# Altium footprint library My_Intlib.PcbLib: 224 footprints (part 5 of 14)
Each footprint in its own frame and in the unit in brackets; x right, y up, seen from the top. Pads: shape width x height; smd on the part's side, far side on the other; paste and mask are expansions set on the pad; w line width, h text height; cw(c..) or ccw(c..) is an arc to the next point about the centre after c.
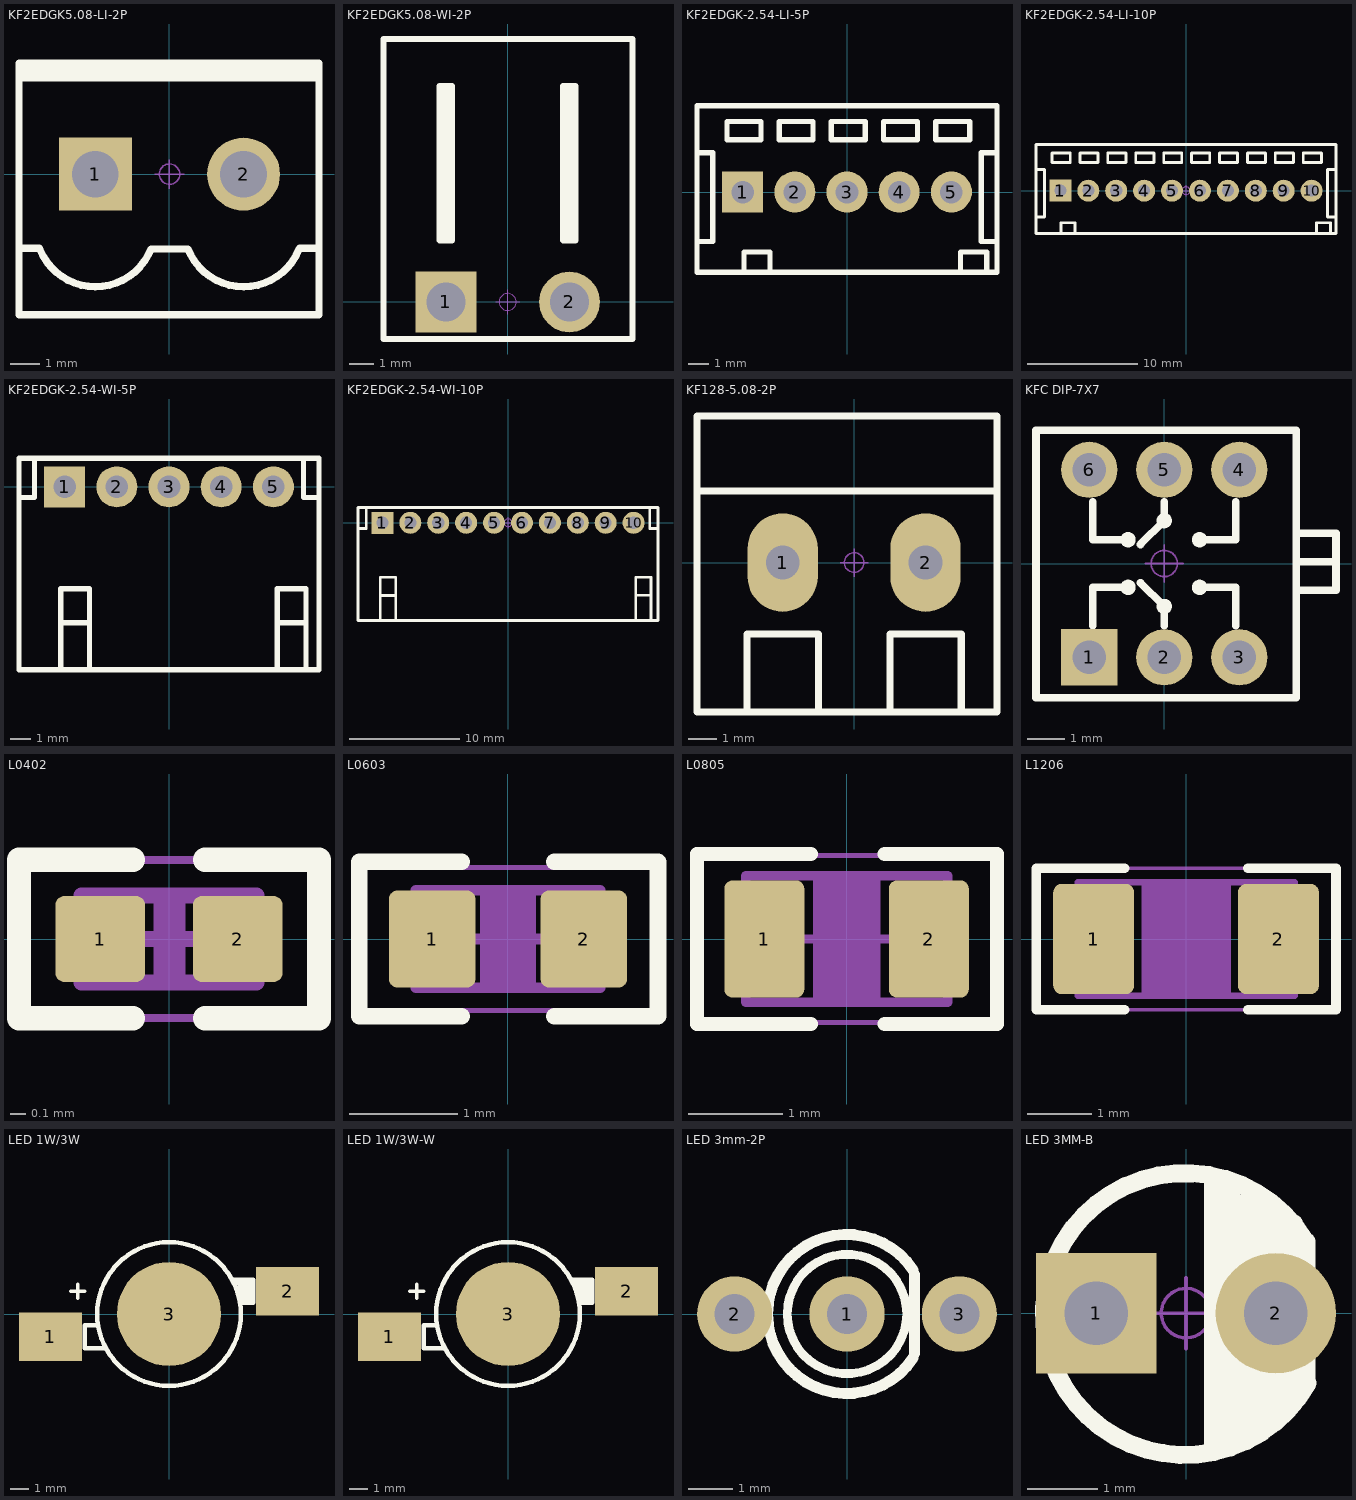
[diagram p4: the footprints below, top view; thin cyan lines are the x and y axes]

## KF2EDGK5.08-LI-2P [mm] "立插端子"
pads (2):
  rect 2.5x2.5 hole 1.6: 1(-2.54,0)
  round 2.5 hole 1.6: 2(2.54,0)
Top Overlay:
  lines w0.254: -5.16,3.302 5.127,3.302 ; -5.16,3.556 5.127,3.556 ; -5.08,-2.54 -4.47,-2.54 ; -4.445,-2.565 ccw(c-2.54,-1.812) -0.635,-2.565 0,-2.565 0.635,-2.565 ccw(c2.54,-1.812) 4.445,-2.565 ; 4.47,-2.54 5.08,-2.54 ; -5.16,-4.826 -5.16,3.81 5.127,3.81 5.127,-4.826 -5.16,-4.826
Mechanical 15:
  circle w0.05: c0,0 r0.35
  lines w0.05: -0.5,0 0.5,0 ; 0,-0.5 0,0.5
3D body "KF2EDGK-1P.STEP": height 11.25, standoff -2.95, extent -5.08,-4.75 0,3.75
3D body "KF2EDGK-1P.STEP": height 11.25, standoff -2.95, extent 0,-4.75 5.08,3.75

## KF2EDGK5.08-WI-2P [mm] "卧插端子"
pads (2):
  rect 2.5x2.5 hole 1.6: 1(-2.54,0)
  round 2.5 hole 1.6: 2(2.54,0)
Top Overlay:
  lines w0.254: -2.54,2.54 -2.54,8.89 ; 2.54,2.54 2.54,8.89 ; -2.54,8.89 -2.794,8.89 -2.794,2.54 -2.286,2.54 -2.286,8.89 -2.54,8.89 ; 2.54,8.89 2.794,8.89 2.794,2.54 2.286,2.54 2.286,8.89 2.54,8.89 ; -5.105,-1.524 -5.105,10.82 5.131,10.82 5.131,-1.524 -5.105,-1.524
Mechanical 15:
  circle w0.05: c0,0 r0.35
  lines w0.05: -0.5,0 0.5,0 ; 0,-0.5 0,0.5
3D body "KF2EDGK-1P_H.STEP": height 8.5, standoff -3, extent -5.08,-0.5 0,10.8
3D body "KF2EDGK-1P_H.STEP": height 8.5, standoff -3, extent 0,-0.5 5.08,10.8

## KF2EDGK-2.54-LI-5P [mm] "长：14.6mm，宽：8.1mm，高：10.1mm"
pads (5):
  rect 2x2 hole 1.1: 1(-5.08,0)
  round 2 hole 1.1: 2(-2.54,0) 3(0,0) 4(2.54,0) 5(5.08,0)
Top Overlay:
  lines w0.254: -5.014,-3.839 -5.014,-2.912 -3.744,-2.912 -3.744,-3.839 ; 5.527,-3.839 5.527,-2.912 6.797,-2.912 6.797,-3.839 ; 7.3,-2.404 6.538,-2.404 6.538,1.914 7.3,1.914 ; -7.3,-2.404 -7.3,1.914 ; -7.3,-2.404 -6.538,-2.404 -6.538,1.914 -7.3,1.914 ; -7.3,-2.404 -7.3,-3.9 7.3,-3.9 7.3,1.914 ; -7.3,1.914 -7.3,4.2 7.3,4.2 7.3,1.914 ; -5.842,2.549 -4.191,2.549 -4.191,3.438 -5.842,3.438 -5.842,2.549 ; -3.302,2.549 -1.651,2.549 -1.651,3.438 -3.302,3.438 -3.302,2.549 ; -0.762,2.549 0.889,2.549 0.889,3.438 -0.762,3.438 -0.762,2.549 ; 1.778,2.549 3.429,2.549 3.429,3.438 1.778,3.438 1.778,2.549 ; 4.318,2.549 4.318,3.438 5.969,3.438 5.969,2.549 4.318,2.549
Mechanical 15:
  circle w0.05: c0,0 r0.35
  lines w0.05: -0.5,0 0.5,0 ; 0,-0.5 0,0.5
3D body "KF2EDGK-2.54-LI-5P.STEP": height 10.15, standoff -3.15, extent -7.3,-3.9 7.3,4.2

## KF2EDGK-2.54-LI-10P [mm] "长：27.3mm，宽：8.1mm，高：10.1mm"
pads (10):
  rect 2x2 hole 1.1: 1(-11.43,0)
  round 2 hole 1.1: 2(-8.89,0) 3(-6.35,0) 4(-3.81,0) 5(-1.27,0) 6(1.27,0) 7(3.81,0) 8(6.35,0) 9(8.89,0) 10(11.43,0)
Top Overlay:
  lines w0.254: -11.364,-3.839 -11.364,-2.912 -10.094,-2.912 -10.094,-3.839 ; 11.877,-3.839 11.877,-2.912 13.147,-2.912 13.147,-3.839 ; 13.65,-2.404 12.888,-2.404 12.888,1.914 13.65,1.914 ; -13.65,-2.404 -13.65,-3.9 13.65,-3.9 13.65,1.914 ; -13.65,-2.404 -12.888,-2.404 -12.888,1.914 -13.65,1.914 ; -13.65,-2.404 -13.65,1.914 ; -13.65,1.914 -13.65,4.2 13.65,4.2 13.65,1.914 ; -12.192,2.549 -12.192,3.438 -10.541,3.438 -10.541,2.549 -12.192,2.549 ; -9.652,2.549 -9.652,3.438 -8.001,3.438 -8.001,2.549 -9.652,2.549 ; -7.112,2.549 -7.112,3.438 -5.461,3.438 -5.461,2.549 -7.112,2.549 ; -4.572,2.549 -4.572,3.438 -2.921,3.438 -2.921,2.549 -4.572,2.549 ; -2.032,2.549 -0.381,2.549 -0.381,3.438 -2.032,3.438 -2.032,2.549 ; 0.508,2.549 0.508,3.438 2.159,3.438 2.159,2.549 0.508,2.549 ; 3.048,2.549 3.048,3.438 4.699,3.438 4.699,2.549 3.048,2.549 ; 5.588,2.549 5.588,3.438 7.239,3.438 7.239,2.549 5.588,2.549 ; 8.128,2.549 8.128,3.438 9.779,3.438 9.779,2.549 8.128,2.549 ; 10.668,2.549 12.319,2.549 12.319,3.438 10.668,3.438 10.668,2.549
Mechanical 15:
  circle w0.05: c0,0 r0.35
  lines w0.05: -0.5,0 0.5,0 ; 0,-0.5 0,0.5
3D body "KF2EDGK-2.54-LI-10P.STEP": height 10.15, standoff -3.15, extent -13.65,-3.9 13.65,4.2

## KF2EDGK-2.54-WI-5P [mm] "长：14.6mm，宽：10.1mm，高：8.1mm"
pads (5):
  rect 2x2 hole 1.1: 1(-5.08,0)
  round 2 hole 1.1: 2(-2.54,0) 3(0,0) 4(2.54,0) 5(5.08,0)
Top Overlay:
  lines w0.254: -7.3,-0.518 -6.543,-0.518 -6.543,1.387 ; -5.268,-8.9 -5.268,-4.963 -3.871,-4.963 -3.871,-8.9 ; -5.268,-6.614 -3.871,-6.614 ; 5.268,-8.9 5.268,-4.963 6.665,-4.963 6.665,-8.9 ; 5.268,-6.614 6.665,-6.614 ; 6.543,1.387 6.543,-0.518 7.3,-0.518 ; -7.3,-8.9 7.3,-8.9 7.3,1.387 -7.3,1.387 -7.3,-8.9
Mechanical 15:
  circle w0.05: c0,0 r0.35
  lines w0.05: -0.5,0 0.5,0 ; 0,-0.5 0,0.5
3D body "KF2EDGK-2.54-WI-5P.STEP": height 8.15, standoff -3.25, extent -7.3,-8.9 7.3,1.2

## KF2EDGK-2.54-WI-10P [mm] "长：27.3mm，宽：10.1mm，高：8.1mm"
pads (10):
  rect 2x2 hole 1.1: 1(-11.43,0)
  round 2 hole 1.1: 2(-8.89,0) 3(-6.35,0) 4(-3.81,0) 5(-1.27,0) 6(1.27,0) 7(3.81,0) 8(6.35,0) 9(8.89,0) 10(11.43,0)
Top Overlay:
  lines w0.254: -13.65,-0.518 -12.893,-0.518 -12.893,1.387 ; -13.65,1.387 -13.65,-8.9 13.65,-8.9 ; -13.65,1.397 13.65,1.397 13.65,-8.89 ; -11.618,-8.9 -11.618,-4.963 -10.221,-4.963 -10.221,-8.9 ; -11.618,-6.614 -10.221,-6.614 ; 11.618,-8.89 11.618,-4.953 13.015,-4.953 13.015,-8.89 ; 11.618,-6.604 13.015,-6.604 ; 12.893,1.397 12.893,-0.508 13.65,-0.508
Mechanical 15:
  circle w0.05: c0,0 r0.35
  lines w0.05: -0.5,0 0.5,0 ; 0,-0.5 0,0.5
3D body "KF2EDGK-2.54-WI-10P.STEP": height 8.15, standoff -3.25, extent -13.65,-8.9 13.65,1.2

## KF128-5.08-2P [mm] "螺钉式接线端子，脚距5.08mm"
pads (2):
  oval 2.5x3.5 hole 1.2: 1(-2.54,0) 2(2.54,0)
Top Overlay:
  lines w0.254: -5.588,2.54 5.08,2.54 ; -3.81,-5.309 -3.81,-2.54 -1.27,-2.54 -1.27,-5.309 ; 1.27,-5.309 1.27,-2.54 3.81,-2.54 3.81,-5.309 ; -5.588,-5.309 -5.588,5.207 5.08,5.207 5.08,-5.309 -5.588,-5.309
Mechanical 15:
  circle w0.05: c0,0 r0.35
  lines w0.05: -0.5,0 0.5,0 ; 0,-0.5 0,0.5
3D body "KF128-5.08.STEP": height 14.15, standoff -3.95, extent -5.58,-5.3 0,5.2
3D body "KF128-5.08.STEP": height 14.15, standoff -3.95, extent -0.5,-5.3 5.08,5.2

## KFC DIP-7X7 [mm] "自锁开关，规格：7*7mm"
pads (6):
  rect 1.5x1.5 hole 0.9: 1(-2,-2.5)
  round 1.5 hole 0.9: 2(0,-2.5) 3(2,-2.5) 4(2,2.5) 5(0,2.5) 6(-2,2.5)
Top Overlay:
  circle w0.254: c0.94,-0.635 r0.076
  circle w0.254: c-0.965,-0.635 r0.076
  circle w0.254: c0,-1.143 r0.076
  circle w0.254: c0,1.143 r0.076
  circle w0.254: c-0.965,0.635 r0.076
  circle w0.254: c0.94,0.635 r0.076
  lines w0.203: -1.905,-1.651 -1.905,-0.635 -0.889,-0.635 ; -1.905,1.651 -1.905,0.635 -0.889,0.635 ; -0.635,-0.508 0,-1.143 0,-1.651 ; -0.635,0.508 0,1.143 0,1.651 ; 1.016,-0.635 1.905,-0.635 1.905,-1.651 ; 1.016,0.635 1.905,0.635 1.905,1.651 ; 3.514,0.05 4.579,0.05 ; 3.563,-0.712 4.579,-0.712 4.579,0.812 3.563,0.812 ; -3.42,-3.581 3.514,-3.581 3.514,2.54 3.514,3.556 -3.42,3.556 -3.42,-3.581
Mechanical 15:
  circle w0.05: c0,0 r0.35
  lines w0.05: -0.5,0 0.5,0 ; 0,-0.5 0,0.5
3D body "SLSW 7x7.STEP": height 11.2, standoff -3.2, extent -3.5,-3.5 3.5,3.5

## L0402 [mm]
pads (2):
  rrect20% 0.566x0.54 smd mask+0.051: 1(-0.433,0) 2(0.433,0)
Top Overlay:
  lines w0.152: -0.226,-0.499 -0.944,-0.499 -0.944,0.499 -0.226,0.499 ; 0.226,-0.499 0.944,-0.499 0.944,0.499 0.226,0.499
Mechanical 1:
  pour cut-out: -0.097,0.275 0.101,0.275 0.101,-0.275 -0.097,-0.275
Top Value:
  text ".Comment" at 1.168,-0.533 h0.76
Top Assembly:
  lines w0.1: -0.55,-0.275 -0.55,0.275 0.55,0.275 0.55,-0.275 -0.55,-0.275
  text ".Designator" at 1.118,0.127 h0.76
Mechanical 15:
  lines w0.05: -0.944,-0.499 -0.944,0.499 0.944,0.499 0.944,-0.499 -0.944,-0.499
  lines w0.1: -0.275,0 0.275,0 ; 0,-0.275 0,0.275
3D body "0402_L.STEP": height 0.49, standoff -0.01, extent -0.5,-0.243 0.5,0.257

## L0603 [mm]
pads (2):
  rrect20% 0.8x0.9 smd: 1(-0.7,0) 2(0.7,0)
Top Overlay:
  lines w0.152: -0.426,-0.711 -1.372,-0.711 -1.372,0.711 -0.426,0.711 ; 0.426,-0.711 1.385,-0.711 1.385,0.711 0.426,0.711
Mechanical 1:
  pour cut-out: -0.254,0.45 0.254,0.45 0.254,-0.45 -0.254,-0.45
Top Value:
  text ".Comment" at -0.8,-1.017 h0.89
Top Assembly:
  lines w0.1: -0.85,-0.45 -0.85,0.45 0.85,0.45 0.85,-0.45 -0.85,-0.45
  text ".Designator" at -0.762,-0.275 h0.89
Mechanical 15:
  lines w0.05: -1.385,-0.661 -1.385,0.661 1.385,0.661 1.385,-0.661 -1.385,-0.661
  lines w0.1: -0.45,0 0.45,0 ; 0,-0.45 0,0.45
3D body "INDC1608X08N.step": height 0.8, standoff 0, extent -0.8,-0.4 0.8,0.4

## L0805 [mm]
pads (2):
  rrect20% 0.85x1.25 smd: 1(-0.875,0) 2(0.875,0)
Top Overlay:
  lines w0.152: -1.592,-0.904 -0.381,-0.904 ; -1.592,-0.889 -1.592,0.889 ; -1.592,0.904 -0.381,0.904 ; 0.406,-0.904 1.6,-0.904 ; 0.406,0.904 1.6,0.904 ; 1.6,-0.889 1.6,0.889
Mechanical 1:
  pour cut-out: -0.356,0.675 0.356,0.675 0.356,-0.675 -0.356,-0.675
Top Value:
  text ".Comment" at -0.762,-1.144 h0.89
Top Assembly:
  lines w0.1: -1.075,-0.675 -1.075,0.675 1.075,0.675 1.075,-0.675 -1.075,-0.675
  text ".Designator" at -0.762,-0.275 h0.89
Mechanical 15:
  lines w0.05: 1.6,-0.889 -1.592,-0.889 -1.592,0.889 1.6,0.889 1.6,-0.864
  lines w0.1: -0.5,0 0.5,0 ; 0,-0.5 0,0.5
3D body "45620.stp": height 1.25, standoff 0, extent -1,-0.625 1,0.625

## L1206 [mm]
pads (2):
  rrect20% 1.25x1.7 smd mask+0.102: 1(-1.425,0) 2(1.425,0)
Top Overlay:
  lines w0.152: -0.951,-1.092 -2.311,-1.092 -2.311,1.092 -0.951,1.092 ; 0.951,-1.092 2.311,-1.092 2.311,1.092 0.951,1.092
Mechanical 1:
  pour cut-out: -0.686,0.875 0.686,0.875 0.686,-0.875 -0.686,-0.875
Top Value:
  text ".Comment" at -1.016,-1.144 h0.89
Top Assembly:
  lines w0.1: -1.675,-0.875 -1.675,0.875 1.675,0.875 1.675,-0.875 -1.675,-0.875
  text ".Designator" at -1.016,-0.275 h0.89
Mechanical 15:
  lines w0.05: -2.316,1.085 -2.316,-1.093 2.314,-1.093 2.314,1.093 -2.316,1.093
  lines w0.1: -0.5,0 0.5,0 ; 0,-0.5 0,0.5
3D body "CircuitWorks-CAPACITOR 1206.STEP": height 1.65, standoff -0.01, extent -1.6,-0.78 1.6,0.78

## LED 1W/3W [mm] "大功率LED"
pads (3):
  rect 3.5x2.7 smd: 1(-6.604,-1.27) 2(6.604,1.27)
  round 5.8 smd: 3(0,0)
Top Overlay:
  circle w0.254: c0,0 r4
  lines w0.203: -5.461,1.27 -4.699,1.27 ; -5.08,0.889 -5.08,1.651
  lines w0.254: -4.064,-0.635 -4.699,-0.635 -4.699,-1.905 -3.556,-1.905 ; 3.937,1.524 ccw(c3.556,1.524) 3.556,1.905 4.699,1.905 4.699,0.635 4.064,0.635 cw(c4.064,0.762) 3.937,0.762 3.937,1.905 ; 4.191,0.635 4.191,1.905 ; 4.445,0.635 4.445,1.905
Mechanical 15:
  circle w0.05: c0,0 r0.35
  lines w0.05: -0.5,0 0.5,0 ; 0,-0.5 0,0.5
3D body "LED 1W 透明胶.STEP": height 5.26, standoff 2.46, extent -2.745,-2.745 2.745,2.745
3D body "LED 1W 基体-无色.STEP": height 3.65, standoff 0.04, extent -7.2,-4 7.2,4

## LED 1W/3W-W [mm] "白色，大功率LED"
pads (3):
  rect 3.5x2.7 smd: 1(-6.604,-1.27) 2(6.604,1.27)
  round 5.8 smd: 3(0,0)
Top Overlay:
  circle w0.254: c0,0 r4
  circle w0.254: c0,0 r2.65
  lines w0.203: -5.461,1.27 -4.699,1.27 ; -5.08,0.889 -5.08,1.651
  lines w0.254: -4.064,-0.635 -4.699,-0.635 -4.699,-1.905 -3.556,-1.905 ; 3.556,1.905 4.699,1.905 4.699,0.635 4.064,0.635 4.064,1.778 ccw(c3.937,1.778) 3.937,1.905 ; 3.683,1.905 cw(c3.683,1.778) 3.81,1.778 3.81,1.524 ; 3.81,1.905 cw(c3.81,1.778) 3.937,1.778 3.937,1.27 ; 4.191,0.635 4.191,1.905 ; 4.445,0.635 4.445,1.905
Mechanical 15:
  circle w0.05: c0,0 r0.35
  lines w0.05: -0.5,0 0.5,0 ; 0,-0.5 0,0.5
3D body "LED 1W 基体.STEP": height 3.65, standoff 0.04, extent -7.2,-4 7.2,4
3D body "LED 1W 透明胶.STEP": height 5.26, standoff 2.46, extent -2.745,-2.745 2.745,2.745

## LED 3mm-2P [mm] "3mm双色LED"
height 5
pads (3):
  round 1.7 hole 0.9: 1(0,0) 2(-2.54,0) 3(2.54,0)
Top Overlay:
  circle w0.2: c0,0 r1.35
  lines w0.254: 1.494,-0.996 cw(c0,0) 1.494,0.996 ; 1.524,-0.889 1.524,0.889
3D body "3MM 双色LED-灯罩.STEP": height 6.9, standoff 1.4, extent -1.95,-1.95 1.696,1.95
3D body "3MM ˫ɫLED.STEP": height 3.82, standoff -3.15, extent -2.79,-0.75 2.79,0.75

## LED 3MM-B [mm] "蓝色3mm直插LED"
height 6.35
pads (2):
  rect 1.7x1.7 hole 0.9: 1(-1.27,0)
  round 1.7 hole 0.9: 2(1.27,0)
Top Overlay:
  lines w0.254: 0.381,-1.905 0.381,1.905 ; 0.635,-1.778 0.635,1.778 ; 1.016,-1.651 1.016,1.524 ; 1.524,1.27 1.524,-1.27 1.27,-1.524 1.27,1.397 1.143,1.524 1.016,1.524 ; 1.685,1.025 ccw(c-0.016,-0.012) 1.72,-0.987 ; 1.702,-0.965 1.702,1.016 ; 0.889,1.651 1.016,1.524 ; 0.889,1.651 0.889,-1.778 0.889,1.651
Mechanical 15:
  circle w0.05: c0,0 r0.35
  lines w0.05: -0.5,0 0.5,0 ; 0,-0.5 0,0.5
3D body "LED 3mm-B.STEP": height 3, standoff -3.45, extent -1.623,-0.838 1.618,0.838
3D body "LED 3mm-玻璃罩.STEP": height 5.55, standoff 0.05, extent -1.95,-1.947 1.638,1.947